# Altium footprint library LimeNet-Micro_2v1.PcbLib: 86 footprints (part 3 of 6)
Each footprint in its own frame and in the unit in brackets; x right, y up, seen from the top. Pads: shape width x height; smd on the part's side, far side on the other; paste and mask are expansions set on the pad; w line width, h text height; cw(c..) or ccw(c..) is an arc to the next point about the centre after c.
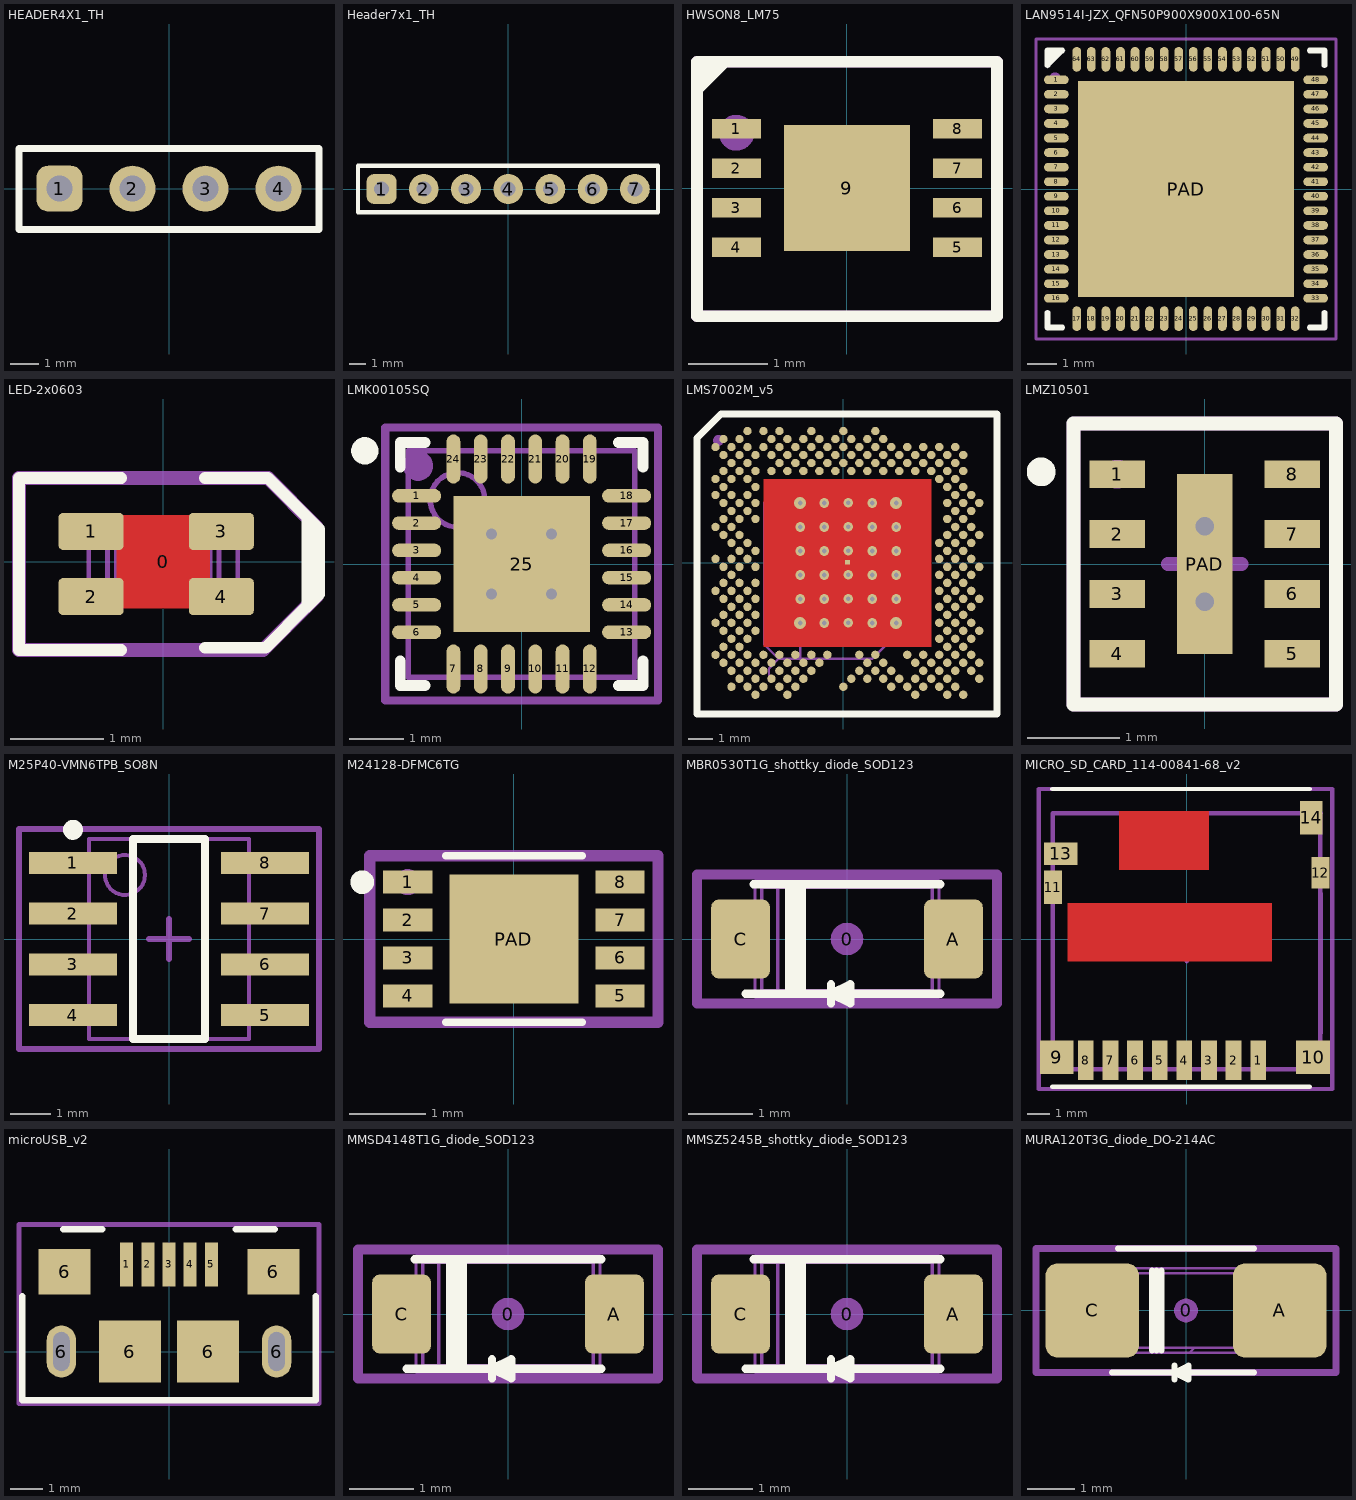
[diagram p2: the footprints below, top view; thin cyan lines are the x and y axes]

## HEADER4X1_TH [mm]
pads (4):
  rrect50% 1.6x1.6 hole 0.9: 1(-3.814,0)
  round 1.6 hole 0.9: 2(-1.271,0) 3(1.271,0) 4(3.814,0)
Top Overlay:
  lines w0.254: -5.225,-1.425 -5.225,1.4 5.225,1.4 5.225,-1.425 -5.225,-1.425
Mechanical 15:
  lines w0.15: -5.225,-1.425 5.225,-1.425 5.225,1.4 -5.225,1.4 -5.225,-1.425
  text ".Designator" at 0.291,-0.875 h0.55
3D body "65775.stp": height 8.54, standoff -3, extent -5.084,-1.27 -2.544,1.27
3D body "65775.stp": height 8.54, standoff -3, extent -2.541,-1.27 -0.001,1.27
3D body "65775.stp": height 8.54, standoff -3, extent 0.001,-1.27 2.541,1.27
3D body "65775.stp": height 8.54, standoff -3, extent 2.544,-1.27 5.084,1.27

## Header7x1_TH [mm]
pads (7):
  rrect50% 1.8x1.8 hole 0.9: 1(-7.629,0)
  round 1.8 hole 0.9: 2(-5.086,0) 3(-2.543,0) 4(0,0) 5(2.543,0) 6(5.086,0) 7(7.629,0)
Top Overlay:
  lines w0.254: -9.05,-1.4 9.025,-1.4 9.025,1.4 -9.05,1.4 -9.05,-1.4
Mechanical 15:
  lines w0.15: -9.05,-1.4 -9.05,1.4 9.025,1.4 9.025,-1.4 -9.05,-1.4
  text ".Designator" at 0.475,-0.625 h0.55
3D body "65775.stp": height 8.54, standoff -3, extent -8.899,-1.27 -6.359,1.27
3D body "65775.stp": height 8.54, standoff -3, extent -6.356,-1.27 -3.816,1.27
3D body "65775.stp": height 8.54, standoff -3, extent -3.813,-1.27 -1.273,1.27
3D body "65775.stp": height 8.54, standoff -3, extent -1.27,-1.27 1.27,1.27
3D body "65775.stp": height 8.54, standoff -3, extent 1.273,-1.27 3.813,1.27
3D body "65775.stp": height 8.54, standoff -3, extent 3.816,-1.27 6.356,1.27
3D body "65775.stp": height 8.54, standoff -3, extent 6.359,-1.27 8.899,1.27

## HWSON8_LM75 [mm]
pads (9):
  rect 0.625x0.25 smd mask+0.05: 1(-1.4,0.75) 2(-1.4,0.25) 3(-1.4,-0.25) 4(-1.4,-0.75) 5(1.4,-0.75) 6(1.4,-0.25) 7(1.4,0.25) 8(1.4,0.75)
  rect 1.6x1.6 smd mask+0.05: 9(0,0)
Top Overlay:
  region: -1.9,1.25 -1.9,1.6 -1.55,1.6
  lines w0.15: -1.9,1.25 -1.55,1.6 ; -1.9,-1.625 -1.9,1.6 1.9,1.6 1.9,-1.625 -1.9,-1.625
Mechanical 15:
  circle w0.254: c-1.4,0.7 r0.1
  lines w0.15: -0.3,0 0.3,0 ; 0,-0.3 0,0.3 ; -1.9,-1.625 -1.9,1.6 1.9,1.6 1.9,-1.625 -1.9,-1.625
  text ".Designator" at 0.725,0.575 h0.55
3D body "User Library-DFN-8.step": height 0.8, standoff 0, extent -1.51,-1.5 1.51,1.5

## LAN9514I-JZX_QFN50P900X900X100-65N [mm]
pads (65):
  oval 0.85x0.3 smd mask+0.05: 1(-4.45,3.75) 2(-4.45,3.25) 3(-4.45,2.75) 4(-4.45,2.25) 5(-4.45,1.75) 6(-4.45,1.25) 7(-4.45,0.75) 8(-4.45,0.25) 9(-4.45,-0.25) 10(-4.45,-0.75) 11(-4.45,-1.25) 12(-4.45,-1.75) 13(-4.45,-2.25) 14(-4.45,-2.75) 15(-4.45,-3.25) 16(-4.45,-3.75) 33(4.45,-3.75) 34(4.45,-3.25) 35(4.45,-2.75) 36(4.45,-2.25) 37(4.45,-1.75) 38(4.45,-1.25) 39(4.45,-0.75) 40(4.45,-0.25) 41(4.45,0.25) 42(4.45,0.75) 43(4.45,1.25) 44(4.45,1.75) 45(4.45,2.25) 46(4.45,2.75) 47(4.45,3.25) 48(4.45,3.75)
  oval 0.3x0.85 smd mask+0.05: 17(-3.75,-4.45) 18(-3.25,-4.45) 19(-2.75,-4.45) 20(-2.25,-4.45) 21(-1.75,-4.45) 22(-1.25,-4.45) 23(-0.75,-4.45) 24(-0.25,-4.45) 25(0.25,-4.45) 26(0.75,-4.45) 27(1.25,-4.45) 28(1.75,-4.45) 29(2.25,-4.45) 30(2.75,-4.45) 31(3.25,-4.45) 32(3.75,-4.45) 49(3.75,4.45) 50(3.25,4.45) 51(2.75,4.45) 52(2.25,4.45) 53(1.75,4.45) 54(1.25,4.45) 55(0.75,4.45) 56(0.25,4.45) 57(-0.25,4.45) 58(-0.75,4.45) 59(-1.25,4.45) 60(-1.75,4.45) 61(-2.25,4.45) 62(-2.75,4.45) 63(-3.25,4.45) 64(-3.75,4.45)
  rect 7.4x7.4 smd mask+0.05: PAD(0,0)
Top Overlay:
  region: -4.75,4.15 -4.15,4.75 -4.75,4.75
  lines w0.2: -4.75,-4.25 -4.75,-4.75 -4.25,-4.75 ; -4.75,4.25 -4.75,4.75 -4.25,4.75 ; 4.25,-4.75 4.75,-4.75 4.75,-4.25 ; 4.25,4.75 4.75,4.75 4.75,4.25
Top Paste:
  region: 1.564,-1.56 3.12,-1.56 3.12,-3.127 1.564,-3.127
  region: -0.782,-1.56 0.78,-1.56 0.78,-3.127 -0.782,-3.127
  region: -3.123,-1.56 -1.56,-1.56 -1.56,-3.123 -3.123,-3.123
  region: -3.124,3.12 -1.56,3.12 -1.56,1.562 -3.124,1.562
  region: -0.782,3.12 0.78,3.12 0.78,1.563 -0.782,1.563
  region: 1.561,3.12 3.12,3.12 3.12,1.561 1.561,1.561
  region: 1.563,0.78 3.12,0.78 3.12,-0.781 1.563,-0.781
  region: -3.123,0.78 -1.56,0.78 -1.56,-0.781 -3.123,-0.781
  region: -0.781,0.78 0.78,0.78 0.78,-0.781 -0.781,-0.781
Mechanical 15:
  circle w0.2: c-4.5,3.8 r0.1
  lines w0.1: -5.15,-5.15 -5.15,5.15 5.15,5.15 5.15,-5.15 -5.15,-5.15
  lines w0.15: -0.9,0 0,0 ; 0,-0.9 0,0 ; 0,0.9 0,0 ; 0.9,0 0,0
  text ".Designator" at 0.95,1.8 h0.55
3D body "User Library-ZM7300G Series.step": height 0.9, standoff 0, extent -4.51,-4.51 4.51,4.51

## LED-2x0603 [mm]
pads (5):
  round 0.254 on Mech15: 0(0,0)
  rrect25% 0.7x0.4 smd: 1(-0.775,0.325) 2(-0.775,-0.375) 3(0.625,0.325) 4(0.625,-0.375)
Top Layer:
  pour cut-out: -0.5,0.5 0.5,0.5 0.5,-0.5 -0.5,-0.5
Top Overlay:
  lines w0.127: -0.45,-0.95 -1.55,-0.95 -1.55,0.9 -0.45,0.9 ; 0.45,-0.925 1.1,-0.925 1.55,-0.475 1.55,0.475 1.125,0.9 0.45,0.9 ; 1.5,0.525 1.675,0.35 1.675,-0.35 1.525,-0.5
Mechanical 13:
  lines w0.05: -0.6,-0.4 -0.6,0.399 0.6,0.4 0.6,-0.4 -0.6,-0.399 ; -0.505,-0.398 -0.505,0.398 ; -0.5,-0.4 -0.8,-0.4 -0.8,0.4 -0.5,0.4 ; 0.5,-0.4 0.8,-0.4 0.8,0.4 0.5,0.4 ; 0.505,-0.398 0.505,0.398 ; -0.599,-0.398 -0.599,0.398 0.599,0.398 0.599,-0.398 -0.599,-0.398
Mechanical 15:
  lines w0.15: -1.55,-0.95 -1.55,0.9 1.125,0.9 1.65,0.375 1.65,-0.375 1.075,-0.95 -1.55,-0.95
  text ".Designator" at -1.2,-1.887 h0.55
  text "C" at 0.6,-0.3 h0.55
  text "A" at -1.2,-0.3 h0.55
3D body "LED 0603 APT1608 GREEN.STEP": height 0.75, standoff 0, extent -0.8,-0.425 0.8,0.375
3D body: height 0.1, standoff 0, extent -0.1,-0.05 0.1,0.05

## LMK00105SQ [mm]
pads (25):
  oval 0.9x0.25 smd mask+0.05: 1(-1.925,1.25) 2(-1.925,0.75) 3(-1.925,0.25) 4(-1.925,-0.25) 5(-1.925,-0.75) 6(-1.925,-1.25) 13(1.925,-1.25) 14(1.925,-0.75) 15(1.925,-0.25) 16(1.925,0.25) 17(1.925,0.75) 18(1.925,1.25)
  oval 0.25x0.9 smd mask+0.05: 7(-1.25,-1.925) 8(-0.75,-1.925) 9(-0.25,-1.925) 10(0.25,-1.925) 11(0.75,-1.925) 12(1.25,-1.925) 19(1.25,1.925) 20(0.75,1.925) 21(0.25,1.925) 22(-0.25,1.925) 23(-0.75,1.925) 24(-1.25,1.925)
  rect 2.5x2.5 smd mask+0.05: 25(0,0)
via -0.55,0.55 diameter 0.5 hole 0.2
via -0.55,-0.55 diameter 0.5 hole 0.2
via 0.55,-0.55 diameter 0.5 hole 0.2
via 0.55,0.55 diameter 0.5 hole 0.2
Top Overlay:
  circle w0.25: c-2.875,2.075 r0.125
  lines w0.2: -2.225,-1.775 -2.225,-2.225 -1.775,-2.225 ; -2.225,1.775 -2.225,2.225 -1.775,2.225 ; 1.775,-2.225 2.225,-2.225 2.225,-1.775 ; 1.775,2.225 2.225,2.225 2.225,1.775
Mechanical 13:
  circle w0.1: c-1.175,1.175 r0.5
  lines w0.1: -2.075,-2.075 -2.075,2.075 2.075,2.075 2.075,-2.075 -2.075,-2.075
Mechanical 15:
  circle w0.35: c-1.9,1.8 r0.1
  lines w0.15: -0.5,0 0.5,0 ; 0,-0.5 0,0.5 ; -2.5,-2.5 -2.5,2.5 2.5,2.5 2.5,-2.5 -2.5,-2.5
  text ".Designator" at 0.975,1.6 h0.55
3D body "User Library-QFN24-0_5.STEP": height 1, standoff 0, extent -2,-2 2,2

## LMS7002M_v5 [mm]
pads (261):
  round 0.35 smd mask+0: A5(-3.998,5.49) A7(-3.332,5.49) A9(-2.666,5.49) A13(-1.334,5.49) A17(-0.002,5.49) A21(1.33,5.49) AA1(-5.33,-1.17) AA3(-4.664,-1.17) AA5(-3.998,-1.17) AA29(3.994,-1.17) AA31(4.66,-1.17) AA33(5.326,-1.17) AB2(-4.997,-1.503) AB4(-4.331,-1.503) AB6(-3.665,-1.503) AB30(4.327,-1.503) AB32(4.993,-1.503) AB34(5.659,-1.503) AC3(-4.664,-1.836) AC5(-3.998,-1.836) AC29(3.994,-1.836) AC31(4.66,-1.836) AC33(5.326,-1.836) AD2(-4.997,-2.169) AD4(-4.331,-2.169) AD6(-3.665,-2.169) AD30(4.327,-2.169) AD32(4.993,-2.169) AE1(-5.33,-2.502) AE3(-4.664,-2.502) AE5(-3.998,-2.502) AE29(3.994,-2.502) AE31(4.66,-2.502) AE33(5.326,-2.502) AF2(-4.997,-2.835) AF4(-4.331,-2.835) AF6(-3.665,-2.835) AF30(4.327,-2.835) AF32(4.993,-2.835) AF34(5.659,-2.835) AG3(-4.664,-3.168) AG5(-3.998,-3.168) AG29(3.994,-3.168) AG31(4.66,-3.168) AG33(5.326,-3.168) AH2(-4.997,-3.501) AH4(-4.331,-3.501) AH30(4.327,-3.501) AH32(4.993,-3.501) AJ1(-5.33,-3.834) AJ3(-4.664,-3.834) AJ5(-3.998,-3.834) AJ7(-3.332,-3.834) AJ9(-2.666,-3.834) AJ11(-2,-3.834) AJ13(-1.334,-3.834) AJ15(-0.668,-3.834) AJ19(0.664,-3.834) AJ21(1.33,-3.834) AJ25(2.662,-3.834) AJ27(3.328,-3.834) AJ29(3.994,-3.834) AJ31(4.66,-3.834) AJ33(5.326,-3.834) AK2(-4.997,-4.167) AK4(-4.331,-4.167) AK6(-3.665,-4.167) AK8(-2.999,-4.167) AK10(-2.333,-4.167) AK12(-1.667,-4.167) AK14(-1.001,-4.167) AK20(0.997,-4.167) AK22(1.663,-4.167) AK26(2.995,-4.167) AK28(3.661,-4.167) AK30(4.327,-4.167) AK32(4.993,-4.167) AK34(5.659,-4.167) AL3(-4.664,-4.5) AL5(-3.998,-4.5) AL7(-3.332,-4.5) AL9(-2.666,-4.5) AL11(-2,-4.5) AL13(-1.334,-4.5) AL19(0.664,-4.5) AL21(1.33,-4.5) AL23(1.996,-4.5) AL27(3.328,-4.5) AL29(3.994,-4.5) AL31(4.66,-4.5) AL33(5.326,-4.5) AM4(-4.331,-4.833) AM6(-3.665,-4.833) AM8(-2.999,-4.833) AM10(-2.333,-4.833) AM12(-1.667,-4.833) AM18(0.331,-4.833) AM20(0.997,-4.833) AM22(1.663,-4.833) AM24(2.329,-4.833) AM26(2.995,-4.833) AM28(3.661,-4.833) AM30(4.327,-4.833) AM34(5.659,-4.833) AN3(-4.664,-5.166) AN5(-3.998,-5.166) AN7(-3.332,-5.166) AN9(-2.666,-5.166) AN11(-2,-5.166) AN17(-0.002,-5.166) AN23(1.996,-5.166) AN25(2.662,-5.166) AN27(3.328,-5.166) AN29(3.994,-5.166) AN31(4.66,-5.166) AP6(-3.665,-5.499) AP10(-2.333,-5.499) AP26(2.995,-5.499) AP30(4.327,-5.499) AP32(4.993,-5.499) B2(-4.997,5.157) B4(-4.331,5.157) B8(-2.999,5.157) B10(-2.333,5.157) B12(-1.667,5.157) B14(-1.001,5.157) B16(-0.335,5.157) B18(0.331,5.157) B20(0.997,5.157) B22(1.663,5.157) C1(-5.33,4.824) C3(-4.664,4.824) C5(-3.998,4.824) C7(-3.332,4.824) C9(-2.666,4.824) C11(-2,4.824) C13(-1.334,4.824) C15(-0.668,4.824) C17(-0.002,4.824) C19(0.664,4.824) C21(1.33,4.824) C23(1.996,4.824) C25(2.662,4.824) C27(3.328,4.824) C29(3.994,4.824) C31(4.66,4.824) D2(-4.997,4.491) D4(-4.331,4.491) D6(-3.665,4.491) D8(-2.999,4.491) D10(-2.333,4.491) D12(-1.667,4.491) D14(-1.001,4.491) D16(-0.335,4.491) D18(0.331,4.491) D20(0.997,4.491) D22(1.663,4.491) D24(2.329,4.491) D26(2.995,4.491) D28(3.661,4.491) D30(4.327,4.491) D32(4.993,4.491) E3(-4.664,4.158) E5(-3.998,4.158) E9(-2.666,4.158) E11(-2,4.158) E13(-1.334,4.158) E15(-0.668,4.158) E17(-0.002,4.158) E19(0.664,4.158) E21(1.33,4.158) E23(1.996,4.158) E25(2.662,4.158) E27(3.328,4.158) E29(3.994,4.158) E31(4.66,4.158) F2(-4.997,3.825) F4(-4.331,3.825) F6(-3.665,3.825) F8(-2.999,3.825) F10(-2.333,3.825) F12(-1.667,3.825) F14(-1.001,3.825) F16(-0.335,3.825) F18(0.331,3.825) F20(0.997,3.825) F22(1.663,3.825) F24(2.329,3.825) F26(2.995,3.825) F28(3.661,3.825) F30(4.327,3.825) F32(4.993,3.825) G1(-5.33,3.492) G3(-4.664,3.492) G5(-3.998,3.492) G29(3.994,3.492) G31(4.66,3.492) H2(-4.997,3.159) H6(-3.665,3.159) H30(4.327,3.159) H32(4.993,3.159) J1(-5.33,2.826) J3(-4.664,2.826) J5(-3.998,2.826) J31(4.66,2.826) J33(5.326,2.826) K2(-4.997,2.493) K4(-4.331,2.493) K6(-3.665,2.493) K30(4.327,2.493) K32(4.993,2.493) K34(5.659,2.493) L3(-4.664,2.16) L5(-3.998,2.16) L31(4.66,2.16) L33(5.326,2.16) M2(-4.997,1.827) M4(-4.331,1.827) M6(-3.665,1.827) M30(4.327,1.827) M32(4.993,1.827) N1(-5.33,1.494) N3(-4.664,1.494) N31(4.66,1.494) N33(5.326,1.494) P2(-4.997,1.161) P4(-4.331,1.161) P30(4.327,1.161) P32(4.993,1.161) P34(5.659,1.161) R3(-4.664,0.828) R5(-3.998,0.828) R29(3.994,0.828) R31(4.66,0.828) R33(5.326,0.828) T4(-4.331,0.495) T6(-3.665,0.495) T30(4.327,0.495) T32(4.993,0.495) U1(-5.33,0.162) U3(-4.664,0.162) U5(-3.998,0.162) U29(3.994,0.162) U31(4.66,0.162) U33(5.326,0.162) V2(-4.997,-0.171) V4(-4.331,-0.171) V6(-3.665,-0.171) V30(4.327,-0.171) V32(4.993,-0.171) V34(5.659,-0.171) W3(-4.664,-0.504) W29(3.994,-0.504) W31(4.66,-0.504) W33(5.326,-0.504) Y2(-4.997,-0.837) Y4(-4.331,-0.837) Y6(-3.665,-0.837) Y30(4.327,-0.837) Y32(4.993,-0.837)
  rect 0.2x0.2 smd: GND(0.175,0.025)
via 0.2,-1.5 diameter 0.4 hole 0.2
via 0.2,-2.5 diameter 0.4 hole 0.2
via 0.2,0.5 diameter 0.4 hole 0.2
via 0.2,-0.5 diameter 0.4 hole 0.2
via 0.2,1.5 diameter 0.4 hole 0.2
via 0.2,2.5 diameter 0.4 hole 0.2
via -0.8,2.49 diameter 0.4 hole 0.2
via -0.8,1.49 diameter 0.4 hole 0.2
via -0.8,-0.51 diameter 0.4 hole 0.2
via -0.8,0.49 diameter 0.4 hole 0.2
via -0.8,-2.51 diameter 0.4 hole 0.2
via -0.8,-1.51 diameter 0.4 hole 0.2
via -1.8,2.49 diameter 0.5 hole 0.2
via -1.8,1.49 diameter 0.4 hole 0.2
via -1.8,-0.51 diameter 0.4 hole 0.2
via -1.8,0.49 diameter 0.4 hole 0.2
via -1.8,-2.51 diameter 0.5 hole 0.2
via -1.8,-1.51 diameter 0.4 hole 0.2
via 2.2,-1.51 diameter 0.4 hole 0.2
via 2.2,-2.51 diameter 0.5 hole 0.2
via 2.2,0.49 diameter 0.4 hole 0.2
via 2.2,-0.51 diameter 0.4 hole 0.2
via 2.2,1.49 diameter 0.4 hole 0.2
via 2.2,2.49 diameter 0.5 hole 0.2
via 1.2,-1.51 diameter 0.4 hole 0.2
via 1.2,-2.51 diameter 0.4 hole 0.2
via 1.2,0.49 diameter 0.4 hole 0.2
via 1.2,-0.51 diameter 0.4 hole 0.2
via 1.2,1.49 diameter 0.4 hole 0.2
via 1.2,2.49 diameter 0.4 hole 0.2
Top Layer:
  rectangle: -3.325,-3.5 3.675,3.5
Top Overlay:
  lines w0.3: -6.1,-6.3 -6.1,5.2 -5.1,6.2 6.4,6.2 6.4,-6.3 -6.1,-6.3
Top Paste:
  drawing of 45 lines, arcs and shapes, not listed
Top Solder:
  rectangle: -3.325,-3.5 3.675,3.5
Mechanical 1:
  lines w0.1: -3.1,-4.7 -3.1,-4.4 -2.7,-4 ; -2.083,2.49 -1.8,2.49 ; -2,-2.71 -1.8,-2.51 ; -1.8,2.207 -1.8,2.49 ; -1.6,-2.71 -1.8,-2.51 ; 1.917,2.49 2.2,2.49 ; 2,-2.71 2.2,-2.51 ; 2.2,2.773 2.2,2.49 ; 2.4,-2.71 2.2,-2.51 ; -3.3,0.99 -3.3,-3.4 -2.7,-4 ; -3.3,0.99 -1.8,2.49 ; -3.3,0.99 -3.3,2.5 -2.7,3.1 1.59,3.1 2.2,2.49 ; -2.7,-4 -1.8,-4 ; -1.8,-4 -1.8,-2.51 ; -1.8,-4 1.2,-4 1.5,-3.7 2.2,-3 2.2,-2.51
  text "0.2mm/0.5mm hole/ring vias under   / pad to be left open (no metal cap)" at 7.194,-4.312 h0.35
Mechanical 15:
  circle w0.35: c-5.2,5.1 r0.05
  lines w0.15: -0.775,0 0,0 ; 0,-0.775 0,0 ; 0,0.775 0,0 ; 0.775,0 0,0 ; -6.1,-6.3 -6.1,5.2 -5.1,6.2 6.4,6.2 6.4,-6.3 -6.1,-6.3
  text "Pad size = 0.35mm / Pad paste mask = 0.35mm / No AM2 pad" at 4.644,-2.962 h0.4
  text "Footprint revision: r5" at 6.069,-5.362 h0.4
  text "1) paste/pad ratio ~60% / 2) 4 thermal pad vias  / without metal cap / 3) all other thermal pad  / vias with metal cap" at 5.419,5.913 h0.4
  text ".Designator" at 2.472,0.369 h0.55
3D body "LMS7002M_11p5x11p5.STEP": height 0.97, standoff 0.03, extent -5.6,-5.75 5.9,5.75

## LMZ10501 [mm]
pads (9):
  rect 0.6x0.3 smd mask+0.07: 1(-0.95,0.975) 2(-0.95,0.325) 3(-0.95,-0.325) 4(-0.95,-0.975) 5(0.95,-0.975) 6(0.95,-0.325) 7(0.95,0.325) 8(0.95,0.975)
  rect 0.6x1.95 smd mask+0.07: PAD(0,0)
via 0,-0.41 diameter 0.4 hole 0.2
via 0,0.41 diameter 0.4 hole 0.2
Top Overlay:
  circle w0.2: c-1.775,1 r0.056
  lines w0.15: -1.425,-1.525 1.425,-1.525 1.425,1.525 -1.425,1.525 -1.425,-1.525
Mechanical 15:
  circle w0.2: c-0.95,0.975 r0.056
  lines w0.15: -0.4,0 0,0 ; 0,-0.4 0,0 ; 0,0.4 0,0 ; 0.4,0 0,0 ; -1.425,-1.525 1.425,-1.525 1.425,1.525 -1.425,1.525 -1.425,-1.525
  text ".Designator" at -1.022,-1.225 h0.55
3D body: height 1.5, standoff 0.5, extent -0.8,-1 0.8,1
3D body: height 0.41, standoff 0, extent -1.313,-1.525 1.312,1.525

## M25P40-VMN6TPB_SO8N [mm]
pads (8):
  rect 2.2x0.55 smd: 1(-2.4,1.905) 2(-2.4,0.635) 3(-2.4,-0.635) 4(-2.4,-1.905) 5(2.4,-1.905) 6(2.4,-0.635) 7(2.4,0.635) 8(2.4,1.905)
Top Overlay:
  circle w0.25: c-2.4,2.73 r0.125
  lines w0.2: -0.9,-2.5 -0.9,2.5 0.9,2.5 0.9,-2.5 -0.9,-2.5
Mechanical 13:
  circle w0.1: c-1.1,1.6 r0.5
  lines w0.1: -2,-2.5 -2,2.5 2,2.5 2,-2.5 -2,-2.5
Mechanical 15:
  lines w0.15: -0.5,0 0.5,0 ; 0,-0.5 0,0.5 ; -3.75,-2.75 -3.75,2.75 3.75,2.75 3.75,-2.75 -3.75,-2.75
  text ".Designator" at -1.475,0.725 h0.55
3D body "CircuitWorks-SO-8.step": height 1.45, standoff 0, extent -2.889,-2.45 2.889,2.452

## M24128-DFMC6TG [mm]
pads (9):
  rect 0.65x0.3 smd mask+0.045: 1(-1.4,0.75) 2(-1.4,0.25) 3(-1.4,-0.25) 4(-1.4,-0.75) 5(1.4,-0.75) 6(1.4,-0.25) 7(1.4,0.25) 8(1.4,0.75)
  rect 1.7x1.7 smd mask+0.05: PAD(0,0)
Top Overlay:
  circle w0.2: c-2,0.75 r0.056
  lines w0.1: -0.9,-1.1 0.9,-1.1 ; -0.9,1.1 0.9,1.1
Mechanical 15:
  circle w0.2: c-1.4,0.75 r0.071
  lines w0.15: -0.3,0 0,0 ; 0,-0.3 0,0 ; 0,0.3 0,0 ; 0.3,0 0,0 ; -1.9,-1.1 -1.9,1.1 1.9,1.1 1.9,-1.1 -1.9,-1.1
  text ".Designator" at 0.275,0.25 h0.55
3D body "User Library-DFN-8-2.step": height 0.9, standoff 0, extent -1.523,-1.006 1.517,0.994

## MBR0530T1G_shottky_diode_SOD123 [mm]
pads (3):
  round 0.508 on Mech15: 0(0,0)
  rrect25% 0.91x1.22 smd: A(1.65,0) C(-1.65,0)
Top Overlay:
  lines w0.127: -1.575,-0.85 1.448,-0.85 ; -1.45,0.85 1.45,0.85 ; -0.9,-0.85 -0.9,0.85 ; -0.8,-0.85 -0.8,0.85 ; -0.7,-0.85 -0.7,0.85 ; -0.25,-1 -0.25,-0.7 ; 0.05,-0.85 -0.25,-0.85 ; -0.25,-0.85 0.05,-0.7 0.05,-1 -0.25,-0.85
Mechanical 13:
  lines w0.05: -1.766,-0.308 -1.766,0.308 ; -1.707,-0.308 -1.707,0.308 ; -1.517,-0.308 -1.517,0.308 ; -1.425,-0.308 -1.95,-0.308 -1.95,0.308 -1.425,0.308 ; 0.075,-0.9 0.177,-0.798 ; 1.425,-0.307 1.95,-0.307 1.95,0.307 1.425,0.307 ; 1.517,-0.308 1.517,0.308 ; 1.707,-0.308 1.707,0.308 ; 1.766,-0.308 1.766,0.308 ; -1.425,0.9 -1.425,-0.9 1.425,-0.9 ; -1.425,0.9 1.425,0.9 ; -1.425,0.9 -1.323,0.798 ; -1.323,0.798 -1.323,-0.798 -1.072,-0.798 ; -1.323,0.798 -1.072,0.798 ; -1.072,-0.798 -1.072,0.798 ; -1.072,-0.798 1.322,-0.797 ; -1.072,0.798 1.322,0.797 ; 1.322,-0.797 1.425,-0.9 ; 1.322,-0.797 1.322,0.797 ; 1.322,0.797 1.425,0.9 ; 1.425,-0.9 1.425,0.9
Mechanical 15:
  lines w0.15: -2.325,-1 -2.325,1 2.325,1 2.325,-1 -2.325,-1
  text ".Designator" at 0.35,-0.25 h0.55
  text "C" at -1.9,-0.275 h0.55
  text "A" at 1.475,-0.275 h0.55
3D body "SOD123.STEP": height 1.18, standoff 0, extent -1.95,-0.9 1.95,0.9

## MICRO_SD_CARD_114-00841-68_v2 [mm]
pads (14):
  rect 0.7x1.75 smd mask+0.1: 1(3.2,-5.412) 6(-2.3,-5.412)
  rect 0.701x1.753 smd mask+0.1: 2(2.1,-5.412) 8(-4.5,-5.412)
  rect 0.701x1.752 smd mask+0.1: 3(1,-5.412) 4(-0.1,-5.412) 5(-1.2,-5.412) 7(-3.4,-5.412)
  rect 1.501x1.501 smd mask+0.1: 9(-5.8,-5.288)
  rect 1.502x1.502 smd mask+0.1: 10(5.65,-5.288)
  rect 0.801x1.501 smd mask+0.1: 11(-5.975,2.312)
  rect 0.8x1.401 smd mask+0.1: 12(5.975,2.963)
  rect 1.5x1 smd mask+0.1: 13(-5.62,3.812)
  rect 1.001x1.502 smd mask+0.1: 14(5.575,5.413)
Top Layer:
  pour cut-out: 3.8,-1 -5.3,-1 -5.3,1.6 3.8,1.6
  pour cut-out: 1,3.1 -3,3.1 -3,5.7 1,5.7
Top Overlay:
  lines w0.2: -6,-6.6 5.5,-6.6 ; -6,6.7 5.5,6.7
Top Solder:
  region: -6.475,3.15 -6.475,4.425 -4.75,4.425 -4.75,3.2 -5.475,3.2 -5.475,3.15
Mechanical 13:
  lines w0.2: -5.975,-5.841 -5.975,5.626 ; -5.975,-5.826 5.976,-5.826 ; -5.975,-4.145 -5.975,-0.109 ; -5.975,-0.104 -5.975,1.237 ; 4.656,5.626 -5.975,5.626 ; 5.982,-5.831 5.982,5.626 ; 5.985,-4.215 5.985,-0.104 ; 5.988,-0.105 5.988,2.043 ; 5.988,5.626 -5.975,5.626
Mechanical 15:
  lines w0.2: -1,0 0,0 ; 0,-1 0,0 ; 0,1 0,0 ; 1,0 0,0 ; -6.6,-6.7 6.5,-6.7 6.5,6.7 -6.6,6.7 -6.6,-6.7
  text ".Designator" at 0.825,1.962 h0.55
  text "1" at 3.325,-4.038 h0.55
  text "8" at -4.225,-4.038 h0.55
3D body "User Library-Micro SD Holder 114-00841-68.step": height 1.6, standoff 0, extent -6,-5.85 6,5.75
3D body "User Library-Micro_SD.step": height 1.45, standoff 0.47, extent -5.5,-9.9 5.5,5.1

## microUSB_v2 [mm]
pads (11):
  rect 0.4x1.35 smd mask+0.05: 1(-1.3,2.675) 2(-0.65,2.675) 3(0,2.675) 4(0.65,2.675) 5(1.3,2.675)
  oval 0.9x1.6 hole 0.5 slot 1.2 at 90 deg: 6(-3.3,0) 6(3.3,0)
  rect 1.6x1.4 smd: 6(-3.2,2.45) 6(3.2,2.45)
  rect 1.9x1.9 smd: 6(-1.2,0) 6(1.2,0)
Top Overlay:
  lines w0.2: -4.5,1.7 -4.5,-1.5 4.5,-1.5 4.5,1.7 ; -3.25,3.75 -2.05,3.75 ; 2.05,3.75 3.25,3.75
Mechanical 15:
  lines w0.15: -4.6,-1.6 -4.6,3.9 4.6,3.9 4.6,-1.6 -4.6,-1.6
  text ".Designator" at 0.65,1.075 h0.55
3D body "USB3090-30-A_revE.step": height 2.59, standoff -1, extent -3.891,-2.565 3.892,2.925

## MMSD4148T1G_diode_SOD123 [mm]
pads (3):
  round 0.508 on Mech15: 0(0,0)
  rrect25% 0.91x1.22 smd: A(1.65,0) C(-1.65,0)
Top Overlay:
  lines w0.127: -1.575,-0.85 1.448,-0.85 ; -1.45,0.85 1.45,0.85 ; -0.9,-0.85 -0.9,0.85 ; -0.8,-0.85 -0.8,0.85 ; -0.7,-0.85 -0.7,0.85 ; -0.25,-1 -0.25,-0.7 ; 0.05,-0.85 -0.25,-0.85 ; -0.25,-0.85 0.05,-1 0.05,-0.7 -0.25,-0.85
Mechanical 13:
  lines w0.05: -1.766,-0.308 -1.766,0.308 ; -1.707,-0.308 -1.707,0.308 ; -1.517,-0.308 -1.517,0.308 ; -1.425,-0.308 -1.95,-0.308 -1.95,0.308 -1.425,0.308 ; 0.075,-0.9 0.177,-0.798 ; 1.425,-0.307 1.95,-0.307 1.95,0.307 1.425,0.307 ; 1.517,-0.308 1.517,0.308 ; 1.707,-0.308 1.707,0.308 ; 1.766,-0.308 1.766,0.308 ; -1.425,0.9 -1.323,0.798 ; -1.425,0.9 1.425,0.9 ; -1.425,0.9 -1.425,-0.9 1.425,-0.9 ; -1.323,0.798 -1.072,0.798 ; -1.323,0.798 -1.323,-0.798 -1.072,-0.798 ; -1.072,-0.798 1.322,-0.797 ; -1.072,-0.798 -1.072,0.798 ; -1.072,0.798 1.322,0.797 ; 1.322,-0.797 1.322,0.797 ; 1.322,-0.797 1.425,-0.9 ; 1.322,0.797 1.425,0.9 ; 1.425,-0.9 1.425,0.9
Mechanical 15:
  lines w0.15: -2.325,-1 2.325,-1 2.325,1 -2.325,1 -2.325,-1
  text "A" at 1.95,-0.101 h0.55
  text "C" at -1.375,-0.201 h0.55
  text ".Designator" at 1.025,-0.576 h0.55
3D body "SOD123.STEP": height 1.18, standoff 0, extent -1.95,-0.9 1.95,0.9

## MMSZ5245B_shottky_diode_SOD123 [mm]
pads (3):
  round 0.508 on Mech15: 0(0,0)
  rrect25% 0.91x1.22 smd: A(1.65,0) C(-1.65,0)
Top Overlay:
  lines w0.127: -1.575,-0.85 1.448,-0.85 ; -1.45,0.85 1.45,0.85 ; -0.9,-0.85 -0.9,0.85 ; -0.8,-0.85 -0.8,0.85 ; -0.7,-0.85 -0.7,0.85 ; -0.25,-1 -0.25,-0.7 ; 0.05,-0.85 -0.25,-0.85 ; -0.25,-0.85 0.05,-0.7 0.05,-1 -0.25,-0.85
Mechanical 13:
  lines w0.05: -1.766,-0.308 -1.766,0.308 ; -1.707,-0.308 -1.707,0.308 ; -1.517,-0.308 -1.517,0.308 ; -1.425,-0.307 -1.95,-0.307 -1.95,0.307 -1.425,0.307 ; 0.075,-0.9 0.177,-0.798 ; 1.425,-0.308 1.95,-0.308 1.95,0.308 1.425,0.308 ; 1.517,-0.308 1.517,0.308 ; 1.707,-0.308 1.707,0.308 ; 1.766,-0.308 1.766,0.308 ; -1.425,0.9 -1.425,-0.9 1.425,-0.9 ; -1.425,0.9 1.425,0.9 ; -1.425,0.9 -1.323,0.798 ; -1.323,0.798 -1.323,-0.798 -1.072,-0.798 ; -1.323,0.798 -1.072,0.798 ; -1.072,-0.798 -1.072,0.798 ; -1.072,-0.798 1.322,-0.797 ; -1.072,0.798 1.322,0.797 ; 1.322,-0.797 1.425,-0.9 ; 1.322,-0.797 1.322,0.797 ; 1.322,0.797 1.425,0.9 ; 1.425,-0.9 1.425,0.9
Mechanical 15:
  lines w0.15: -2.325,-1 -2.325,1 2.325,1 2.325,-1 -2.325,-1
  text ".Designator" at -0.446,-0.125 h0.55
  text "C" at -1.571,0.275 h0.55
  text "A" at 2.029,0.225 h0.55
3D body "SOD123.STEP": height 1.18, standoff 0, extent -1.95,-0.9 1.95,0.9

## MURA120T3G_diode_DO-214AC [mm]
pads (3):
  round 0.508 on Mech15: 0(0,0)
  rrect25% 2x2 smd: A(2,0) C(-2,0)
Top Overlay:
  lines w0.127: -1.575,-1.325 1.448,-1.325 ; -1.45,1.325 1.45,1.325 ; -0.725,-0.85 -0.725,0.85 ; -0.625,-0.85 -0.625,0.85 ; -0.525,-0.85 -0.525,0.85 ; -0.25,-1.475 -0.25,-1.175 ; 0.05,-1.325 -0.25,-1.325 ; -0.25,-1.325 0.05,-1.175 0.05,-1.475 -0.25,-1.325
Mechanical 13:
  lines w0.05: -1.766,-0.308 -1.766,0.308 ; -1.707,-0.308 -1.707,0.308 ; -1.517,-0.308 -1.517,0.308 ; -1.425,-0.308 -1.95,-0.308 -1.95,0.308 -1.425,0.308 ; 0.075,-0.9 0.177,-0.798 ; 1.425,-0.308 1.95,-0.308 1.95,0.308 1.425,0.308 ; 1.517,-0.308 1.517,0.308 ; 1.707,-0.308 1.707,0.308 ; 1.766,-0.308 1.766,0.308 ; -1.425,0.9 -1.425,-0.9 1.425,-0.9 ; -1.425,0.9 1.425,0.9 ; -1.425,0.9 -1.323,0.798 ; -1.323,0.798 -1.323,-0.798 -1.072,-0.798 ; -1.323,0.798 -1.072,0.798 ; -1.072,-0.798 -1.072,0.798 ; -1.072,-0.798 1.322,-0.797 ; -1.072,0.798 1.322,0.797 ; 1.322,-0.797 1.425,-0.9 ; 1.322,-0.797 1.322,0.797 ; 1.322,0.797 1.425,0.9 ; 1.425,-0.9 1.425,0.9
Mechanical 15:
  lines w0.15: -3.2,-1.325 -3.2,1.325 3.2,1.325 3.2,-1.325 -3.2,-1.325
  text ".Designator" at -0.425,0.4 h0.55
  text "C" at -1.9,-0.275 h0.55
  text "A" at 1.475,-0.275 h0.55
3D body "User Library-DO-214AC SMA.SLDPRT": height 2.4, standoff 0, extent -2.6,-1.3 2.6,1.3